# Altium footprint library OpenRec.PcbLib: 90 footprints (part 6 of 6)
Each footprint in its own frame and in the unit in brackets; x right, y up, seen from the top. Pads: shape width x height; smd on the part's side, far side on the other; paste and mask are expansions set on the pad; w line width, h text height; cw(c..) or ccw(c..) is an arc to the next point about the centre after c.
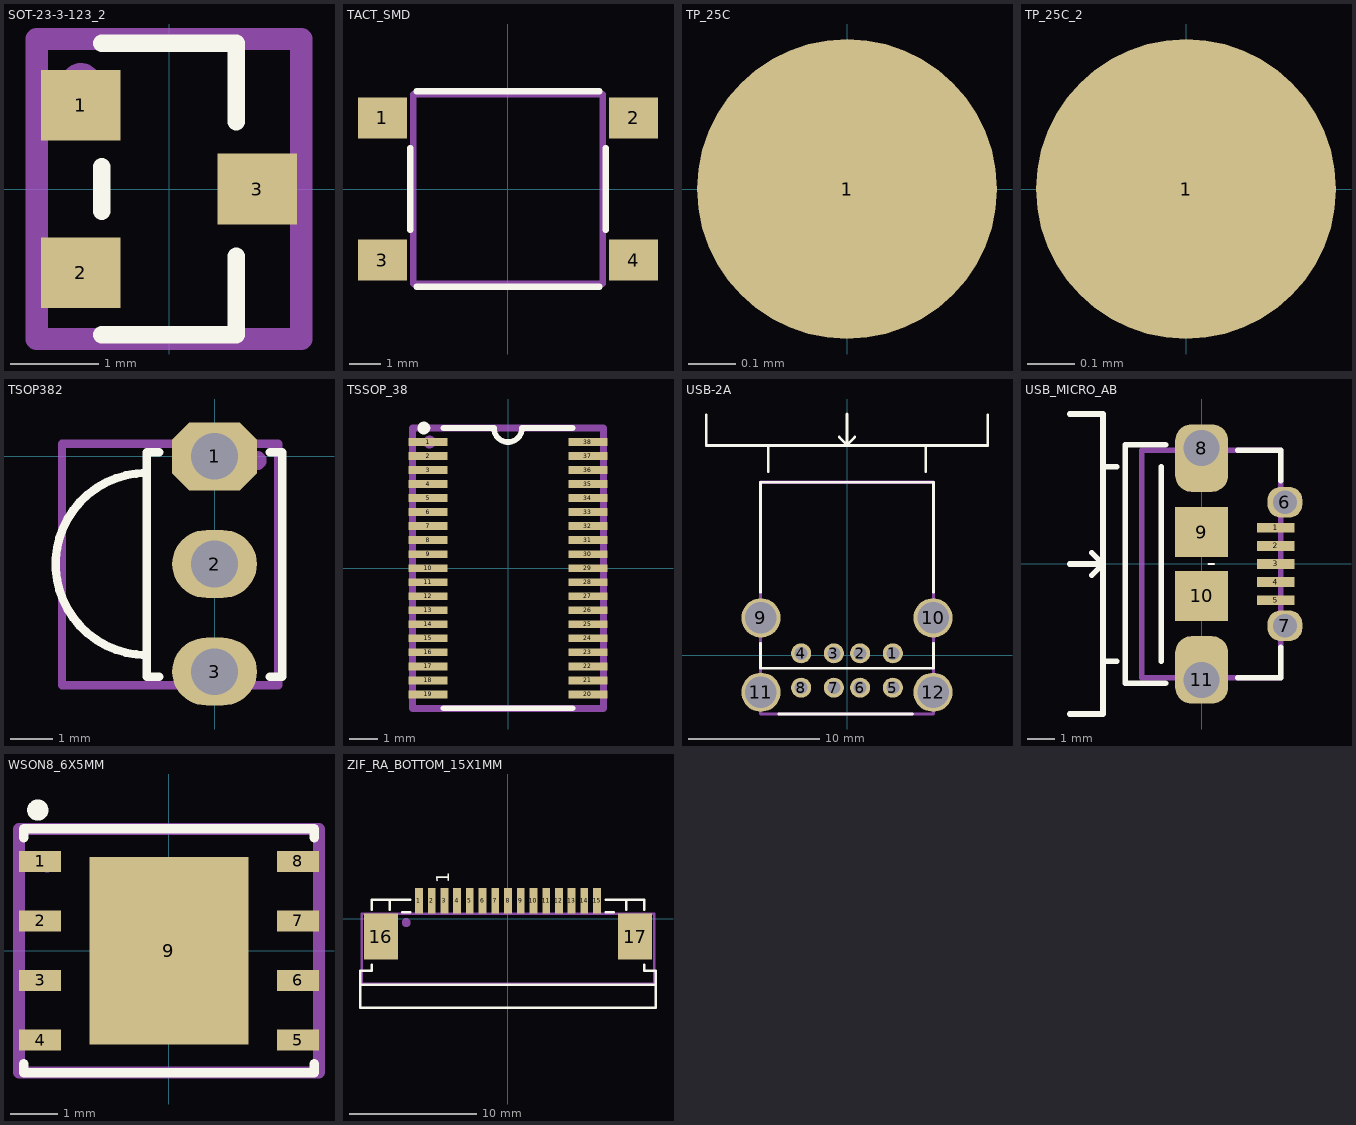
[diagram p5: the footprints below, top view; thin cyan lines are the x and y axes]

## SOT-23-3-123_2 [mm]
pads (3):
  rect 0.9x0.8 smd: 1(-1,0.95) 2(-1,-0.95) 3(1,0)
Top Overlay:
  lines w0.2: -0.762,-1.651 0.762,-1.651 0.762,-0.762 ; -0.762,-0.254 -0.762,0.254 ; -0.762,1.651 0.762,1.651 0.762,0.762
Assembly Drawing:
  circle w0.254: c-1,1.2 r0.1
  lines w0.254: -1.5,-1.7 -1.5,1.7 1.5,1.7 1.5,-1.7 -1.5,-1.7
  text ".Designator" at 0.7,0.3 h0.6
3D body: height 0.5, standoff 0, extent 0.762,-0.381 1.27,0.381
3D body: height 0.5, standoff 0, extent -1.27,-1.333 -0.762,-0.572
3D body: height 0.5, standoff 0, extent -1.27,0.572 -0.762,1.333
3D body: height 1.1, standoff 0, extent -0.762,-1.651 0.762,1.651

## TACT_SMD [mm]
pads (4):
  rect 1.55x1.3 smd mask+0.06: 1(-3.975,2.25) 2(3.975,2.25) 3(-3.975,-2.25) 4(3.975,-2.25)
Top Overlay:
  lines w0.2: -3.1,-1.3 -3.1,1.3 ; -2.9,-3.1 2.9,-3.1 ; -2.9,3.1 2.9,3.1 ; 3.1,-1.3 3.1,1.3
Assembly Drawing:
  lines w0.2: -3,-3 3,-3 3,3 -3,3 -3,-3
  text ".Designator" at 0.35,-1.55 h1.2
3D body "PTS645SL50SMTR92-LFS.STEP": height 5, standoff 0, extent -4.5,-3 4.5,3

## TP_25C [mm]
pads (1):
  round 0.635 smd paste-0.635 mask+0.051: 1(0,0)

## TP_25C_2 [mm]
pads (1):
  round 0.635 smd paste-0.635 mask+0.051: 1(0,0)

## TSOP382 [mm]
pads (3):
  oct 2x1.6 hole 1.1 mask+0.03: 1(0,0)
  oval 2x1.6 hole 1.1 mask+0.03: 2(0,-2.54) 3(0,-5.08)
Top Overlay:
  lines w0.2: -1.6,-4.69 cw(c-1.6,-2.54) -1.6,-0.39 ; -1.3,-5.2 -1.6,-5.2 -1.6,0.1 -1.3,0.1 ; 1.3,-5.2 1.6,-5.2 1.6,0.1 1.3,0.1
Assembly Drawing:
  circle w0.254: c1,-0.1 r0.1
  lines w0.2: -3.6,-5.4 -3.6,0.3 1.5,0.3 1.5,-5.4 -3.6,-5.4
  text ".Designator" at -0.7,-0.74 h1.52
3D body "TO-92_Bent.STEP": height 8, standoff -5, extent -2.604,-5.33 1.6,0.25
3D body: height 10, standoff 3, extent -1.5,-5.1 1.6,0
3D body: height 7.3, standoff 3, extent -3.575,-4.536 0.41,-0.544
3D body: height 9.3, standoff 5.3, extent -3.575,-4.527 0.406,-0.544

## TSSOP_38 [mm]
pads (38):
  rect 1.4x0.28 smd mask+0.025: 1(-2.85,4.5) 2(-2.85,4) 3(-2.85,3.5) 4(-2.85,3) 5(-2.85,2.5) 6(-2.85,2) 7(-2.85,1.5) 8(-2.85,1) 9(-2.85,0.5) 10(-2.85,0) 11(-2.85,-0.5) 12(-2.85,-1) 13(-2.85,-1.5) 14(-2.85,-2) 15(-2.85,-2.5) 16(-2.85,-3) 17(-2.85,-3.5) 18(-2.85,-4) 19(-2.85,-4.5) 20(2.85,-4.5) 21(2.85,-4) 22(2.85,-3.5) 23(2.85,-3) 24(2.85,-2.5) 25(2.85,-2) 26(2.85,-1.5) 27(2.85,-1) 28(2.85,-0.5) 29(2.85,0) 30(2.85,0.5) 31(2.85,1) 32(2.85,1.5) 33(2.85,2) 34(2.85,2.5) 35(2.85,3) 36(2.85,3.5) 37(2.85,4) 38(2.85,4.5)
Top Overlay:
  circle w0.254: c-3,5 r0.1
  lines w0.2: -2.3,-5 2.3,-5 ; -2.3,5 -0.5,5 ccw(c-0.001,5) 0.499,5 ; 0.5,5 2.3,5
Assembly Drawing:
  circle w0.254: c-2.8,4.5 r0.1
  lines w0.254: -3.4,-5 -3.4,5 3.4,5 3.4,-5 -3.4,-5
  text ".Designator" at -0.7,1.8 h1.52
3D body: height 1.2, standoff 0, extent -2.3,-5 2.3,5

## USB-2A [mm]
pads (12):
  round 1.524 hole 1: 1(3.5,0.13) 2(1,0.13) 3(-1,0.13) 4(-3.5,0.13) 5(3.5,-2.49) 6(1,-2.49) 7(-1,-2.49) 8(-3.5,-2.49)
  round 3 hole 2.4: 9(-6.57,2.84) 10(6.57,2.84) 11(-6.57,-2.84) 12(6.57,-2.84)
Top Overlay:
  lines w0.2: -10.75,18.35 -10.75,16 10.75,16 10.75,18.35 ; -6.6,0.9 -6.6,-1 6.6,-1 6.6,0.9 ; -6.6,4.8 -6.6,13.2 6.6,13.2 6.6,4.8 ; -6,14 -6,16 ; -5.2,-4.5 5,-4.5 ; -0.6,16.65 0,16.05 ; 0,18.4 0,16.05 ; 0.6,16.65 0,16.05 ; 6,14 6,16
Assembly Drawing:
  lines w0.254: -6.6,-4.5 -6.6,13.2 6.6,13.2 6.6,-4.5 -6.6,-4.5
  text ".Designator" at -1.1,1.8 h1.52
3D body "c-5787617-1-c-3d.stp": height 15.78, standoff -4.37, extent -8.1,-4.1 8.139,13.08

## USB_MICRO_AB [mm]
pads (11):
  rect 1.35x0.35 smd mask+0.025: 1(2.675,1.3) 2(2.675,0.65) 3(2.675,0) 4(2.675,-0.65) 5(2.675,-1.3)
  rrect84% 1.25x1.1 hole 0.85 mask+0.04: 6(3,2.225) 7(3,-2.225)
  rrect60% 1.9x2.425 hole 1.3 copper offset 0,-0.363: 8(0,4.175)
  rect 1.9x1.8 smd paste-10: 9(0,1.15) 10(0,-1.15)
  rrect60% 1.9x2.425 hole 1.3 copper offset 0,0.363: 11(0,-4.175)
Top Overlay:
  lines w0.08: 0.25,0 0.45,0
  lines w0.2: -4.75,-5.4 -3.55,-5.4 -3.55,5.4 -4.75,5.4 ; -4.75,0 -3.55,0 ; -3.95,-0.4 -3.55,0 ; -3.95,0.4 -3.55,0 ; -3.55,-3.5 -3.05,-3.5 ; -3.55,3.5 -3.05,3.5 ; -1.45,-3.5 -1.45,3.5 ; -1.3,-4.3 -2.75,-4.3 -2.75,4.3 -1.3,4.3 ; 1.3,-4.1 2.85,-4.1 2.85,-3 ; 1.3,4.1 2.85,4.1 2.85,3
Assembly Drawing:
  lines w0.2: -2.15,-4.1 2.85,-4.1 2.85,4.1 -2.15,4.1 -2.15,-4.1
  text ".Designator" at -0.6,1.6 h1.52
3D body "475890001.stp": height 2.76, standoff -0.58, extent -2.75,-4.325 3.045,4.325

## WSON8_6X5MM [mm]
pads (9):
  rect 0.9x0.45 smd: 1(-2.75,1.905) 2(-2.75,0.635) 3(-2.75,-0.635) 4(-2.75,-1.905) 5(2.75,-1.905) 6(2.75,-0.635) 7(2.75,0.635) 8(2.75,1.905)
  rect 3.4x4 smd: 9(0,0)
Top Overlay:
  circle w0.254: c-2.8,3 r0.1
  lines w0.2: -3.1,-2.413 -3.1,-2.6 3.1,-2.6 3.1,-2.413 ; -3.1,2.413 -3.1,2.6 3.1,2.6 3.1,2.413
Assembly Drawing:
  circle w0.254: c-2.6,1.9 r0.1
  lines w0.254: -3.2,-2.6 -3.2,2.6 3.2,2.6 3.2,-2.6 -3.2,-2.6
  text ".Designator" at -0.6,1.9 h1.52
3D body: height 0.8, standoff 0, extent -3,-2.5 3,2.5

## ZIF_RA_BOTTOM_15X1MM [mm]
pads (17):
  rect 0.61x2 smd: 1(-7,1.4) 2(-6,1.4) 3(-5,1.4) 4(-4,1.4) 5(-3,1.4) 6(-2,1.4) 7(-1,1.4) 8(0,1.4) 9(1,1.4) 10(2,1.4) 11(3,1.4) 12(4,1.4) 13(5,1.4) 14(6,1.4) 15(7,1.4)
  rect 2.68x3.6 smd: 16(-9.99,-1.4) 17(9.99,-1.4)
Top Overlay:
  lines w0.2: -11.6,-5.2 11.6,-5.2 ; -10.7,-3.6 -10.7,-4.1 -11.6,-4.1 -11.6,-7 11.6,-7 11.6,-4.1 10.7,-4.1 10.7,-3.6 ; -10.7,0.7 -10.7,1.5 -7.7,1.5 ; -9.3,0.7 -9.3,1.5 ; -8.3,0.5 -7.7,0.5 ; 7.7,0.5 8.3,0.5 ; 7.7,1.5 10.7,1.5 10.7,0.7 ; 9.3,0.7 9.3,1.5
  text "1" at -4.6,2.8 h1.02
Assembly Drawing:
  circle w0.5: c-8,-0.3 r0.1
  lines w0.2: -11.5,-5.1 11.5,-5.1 11.5,0.4 -11.5,0.4 -11.5,-5.1
  text ".Designator" at -2.4,-3 h2
3D body "c-1-84952-5-a-3d.stp": height 2.53, standoff -0.03, extent -11.46,-5.038 11.46,1.502